# Altium footprint library MyPcbLib.PcbLib: 657 footprints (part 29 of 42)
Each footprint in its own frame and in the unit in brackets; x right, y up, seen from the top. Pads: shape width x height; smd on the part's side, far side on the other; paste and mask are expansions set on the pad; w line width, h text height; cw(c..) or ccw(c..) is an arc to the next point about the centre after c.
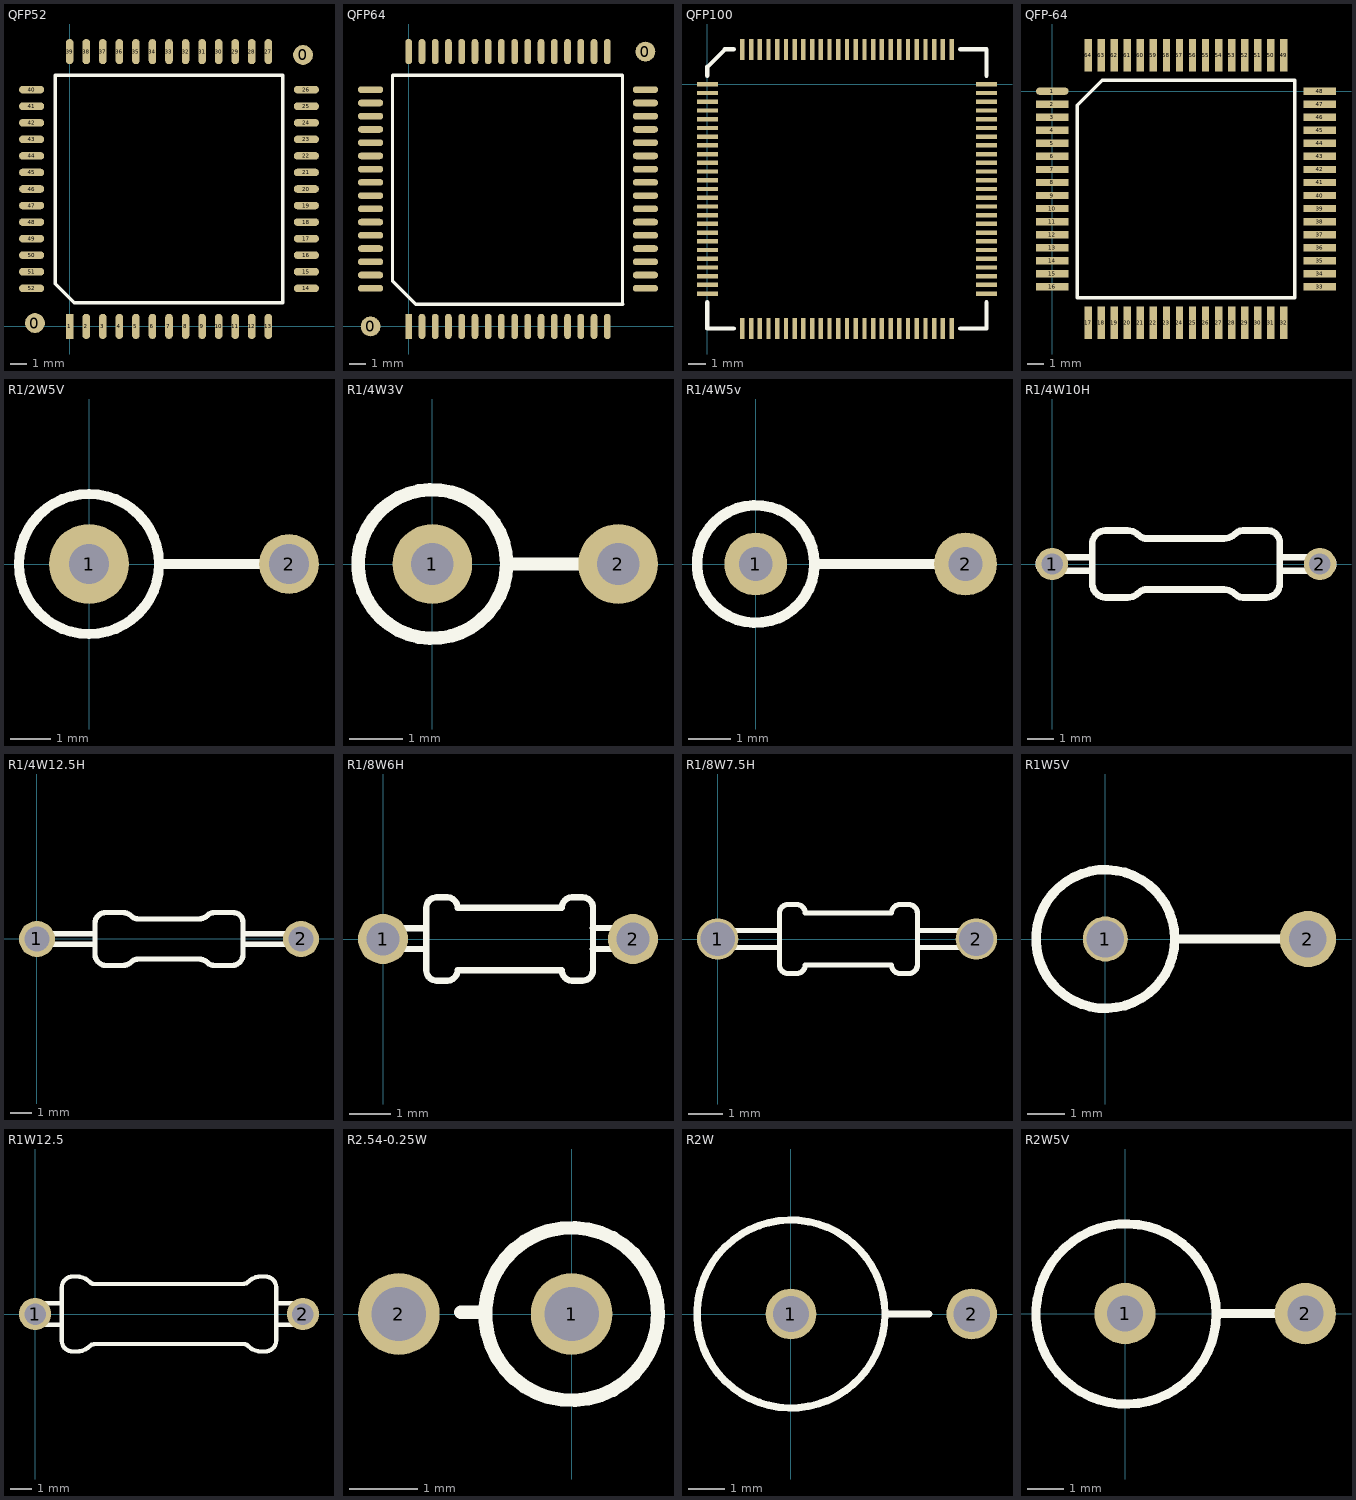
[diagram p28: the footprints below, top view; thin cyan lines are the x and y axes]

## QFP52 [mil]
pads (54):
  round 47.24 smd: 0(-82.68,7.87) 0(555.12,645.67)
  rect 18x60 smd: 1(0,0)
  oval 18x60 smd: 2(39.37,0) 3(78.74,0) 4(118.11,0) 5(157.48,0) 6(196.85,0) 7(236.22,0) 8(275.59,0) 9(314.96,0) 10(354.33,0) 11(393.7,0) 12(433.07,0) 13(472.44,0) 27(472.44,653.54) 28(433.07,653.54) 29(393.7,653.54) 30(354.33,653.54) 31(314.96,653.54) 32(275.59,653.54) 33(236.22,653.54) 34(196.85,653.54) 35(157.48,653.54) 36(118.11,653.54) 37(78.74,653.54) 38(39.37,653.54) 39(0,653.54)
  oval 60x18 smd: 14(562.99,90.55) 15(562.99,129.92) 16(562.99,169.29) 17(562.99,208.66) 18(562.99,248.03) 19(562.99,287.4) 20(562.99,326.77) 21(562.99,366.14) 22(562.99,405.51) 23(562.99,444.88) 24(562.99,484.25) 25(562.99,523.62) 26(562.99,562.99) 40(-90.55,562.99) 41(-90.55,523.62) 42(-90.55,484.25) 43(-90.55,444.88) 44(-90.55,405.51) 45(-90.55,366.14) 46(-90.55,326.77) 47(-90.55,287.4) 48(-90.55,248.03) 49(-90.55,208.66) 50(-90.55,169.29) 51(-90.55,129.92) 52(-90.55,90.55)
Top Overlay:
  lines w7.87: -34.06,101.18 10.63,56.5 506.5,56.5 506.5,597.05 -34.06,597.05 -34.06,101.18

## QFP64 [mil]
pads (66):
  round 47.24 smd: 0(-90.55,0) 0(562.99,653.54)
  rect 16x60 smd: 1(0,0)
  oval 16x60 smd: 2(31.5,0) 3(62.99,0) 4(94.49,0) 5(125.98,0) 6(157.48,0) 7(188.98,0) 8(220.47,0) 9(251.97,0) 10(283.46,0) 11(314.96,0) 12(346.46,0) 13(377.95,0) 14(409.45,0) 15(440.94,0) 16(472.44,0) 33(472.44,653.54) 34(440.94,653.54) 35(409.45,653.54) 36(377.95,653.54) 37(346.46,653.54) 38(314.96,653.54) 39(283.46,653.54) 40(251.97,653.54) 41(220.47,653.54) 42(188.98,653.54) 43(157.48,653.54) 44(125.98,653.54) 45(94.49,653.54) 46(62.99,653.54) 47(31.5,653.54) 48(0,653.54)
  oval 60x16 smd: 17(562.99,90.55) 18(562.99,122.05) 19(562.99,153.54) 20(562.99,185.04) 21(562.99,216.54) 22(562.99,248.03) 23(562.99,279.53) 24(562.99,311.02) 25(562.99,342.52) 26(562.99,374.02) 27(562.99,405.51) 28(562.99,437.01) 29(562.99,468.5) 30(562.99,500) 31(562.99,531.5) 32(562.99,562.99) 49(-90.55,562.99) 50(-90.55,531.5) 51(-90.55,500) 52(-90.55,468.5) 53(-90.55,437.01) 54(-90.55,405.51) 55(-90.55,374.02) 56(-90.55,342.52) 57(-90.55,311.02) 58(-90.55,279.53) 59(-90.55,248.03) 60(-90.55,216.54) 61(-90.55,185.04) 62(-90.55,153.54) 63(-90.55,122.05) 64(-90.55,90.55)
Top Overlay:
  lines w7.87: -38.34,107.06 -38.34,597.65 508.78,597.65 508.78,52.53
  lines w8: -38.34,107.06 -38.05,107.06 16.47,52.53 508.78,52.53

## QFP100 [mm]
pads (100):
  rect 1.2x0.25 smd: 1(0.004,0.002) 2(0.004,-0.498) 3(0.004,-0.998) 4(0.004,-1.498) 5(0.004,-1.998) 6(0.004,-2.498) 7(0.004,-2.998) 8(0.004,-3.498) 9(0.004,-3.998) 10(0.004,-4.498) 11(0.004,-4.998) 12(0.004,-5.498) 13(0.004,-5.998) 14(0.004,-6.498) 15(0.004,-6.998) 16(0.004,-7.498) 17(0.004,-7.998) 18(0.004,-8.498) 19(0.004,-8.998) 20(0.004,-9.498) 21(0.004,-9.998) 22(0.004,-10.498) 23(0.004,-10.998) 24(0.004,-11.498) 25(0.004,-11.998) 51(16.004,-11.998) 52(16.004,-11.498) 53(16.004,-10.998) 54(16.004,-10.498) 55(16.004,-9.998) 56(16.004,-9.498) 57(16.004,-8.998) 58(16.004,-8.498) 59(16.004,-7.998) 60(16.004,-7.498) 61(16.004,-6.998) 62(16.004,-6.498) 63(16.004,-5.998) 64(16.004,-5.498) 65(16.004,-4.998) 66(16.004,-4.498) 67(16.004,-3.998) 68(16.004,-3.498) 69(16.004,-2.998) 70(16.004,-2.498) 71(16.004,-1.998) 72(16.004,-1.498) 73(16.004,-0.998) 74(16.004,-0.498) 75(16.004,0.002)
  rect 0.25x1.2 smd: 26(2.004,-13.998) 27(2.504,-13.998) 28(3.004,-13.998) 29(3.504,-13.998) 30(4.004,-13.998) 31(4.504,-13.998) 32(5.004,-13.998) 33(5.504,-13.998) 34(6.004,-13.998) 35(6.504,-13.998) 36(7.004,-13.998) 37(7.504,-13.998) 38(8.004,-13.998) 39(8.504,-13.998) 40(9.004,-13.998) 41(9.504,-13.998) 42(10.004,-13.998) 43(10.504,-13.998) 44(11.004,-13.998) 45(11.504,-13.998) 46(12.004,-13.998) 47(12.504,-13.998) 48(13.004,-13.998) 49(13.504,-13.998) 50(14.004,-13.998) 76(14.004,2.002) 77(13.504,2.002) 78(13.004,2.002) 79(12.504,2.002) 80(12.004,2.002) 81(11.504,2.002) 82(11.004,2.002) 83(10.504,2.002) 84(10.004,2.002) 85(9.504,2.002) 86(9.004,2.002) 87(8.504,2.002) 88(8.004,2.002) 89(7.504,2.002) 90(7.004,2.002) 91(6.504,2.002) 92(6.004,2.002) 93(5.504,2.002) 94(5.004,2.002) 95(4.504,2.002) 96(4.004,2.002) 97(3.504,2.002) 98(3.004,2.002) 99(2.504,2.002) 100(2.004,2.002)
Top Overlay:
  lines w0.254: 0.004,-12.498 0.004,-13.998 1.504,-13.998 ; 0.004,0.502 0.004,1.002 1.004,2.002 1.504,2.002 ; 14.504,-13.998 16.004,-13.998 16.004,-12.498 ; 14.504,2.002 16.004,2.002 16.004,0.502

## QFP-64 [mm]
pads (64):
  oval 2x0.45 smd: 1(0,0)
  rect 2x0.45 smd: 2(0,-0.8) 3(0,-1.6) 4(0,-2.4) 5(0,-3.2) 6(0,-4) 7(0,-4.8) 8(0,-5.6) 9(0,-6.4) 10(0,-7.2) 11(0,-8) 12(0,-8.8) 13(0,-9.6) 14(0,-10.4) 15(0,-11.2) 16(0,-12) 33(16.4,-12) 34(16.4,-11.2) 35(16.4,-10.4) 36(16.4,-9.6) 37(16.4,-8.8) 38(16.4,-8) 39(16.4,-7.2) 40(16.4,-6.4) 41(16.4,-5.6) 42(16.4,-4.8) 43(16.4,-4) 44(16.4,-3.2) 45(16.4,-2.4) 46(16.4,-1.6) 47(16.4,-0.8) 48(16.4,0)
  rect 0.45x2 smd: 17(2.2,-14.2) 18(3,-14.2) 19(3.8,-14.2) 20(4.6,-14.2) 21(5.4,-14.2) 22(6.2,-14.2) 23(7,-14.2) 24(7.8,-14.2) 25(8.6,-14.2) 26(9.4,-14.2) 27(10.2,-14.2) 28(11,-14.2) 29(11.8,-14.2) 30(12.6,-14.2) 31(13.4,-14.2) 32(14.2,-14.2) 49(14.2,2.2) 50(13.4,2.2) 51(12.6,2.2) 52(11.8,2.2) 53(11,2.2) 54(10.2,2.2) 55(9.4,2.2) 56(8.6,2.2) 57(7.8,2.2) 58(7,2.2) 59(6.2,2.2) 60(5.4,2.2) 61(4.6,2.2) 62(3.8,2.2) 63(3,2.2) 64(2.2,2.2)
Top Overlay:
  lines w0.2: 1.535,-12.665 14.865,-12.665 14.865,0.665 3.07,0.665 1.535,-0.87 1.535,-12.665

## R1/2W5V [mm]
pads (2):
  round 2 hole 1: 1(0,0)
  round 1.5 / inner round 1.5 / far side round 2 hole 1: 2(5,0)
Top Overlay:
  circle w0.254: c0,0 r1.75
  lines w0.25: 1.75,0 5,0

## R1/4W3V [mm]
pads (2):
  round 1.5 / inner round 1.5 / far side round 1.8 hole 0.8: 1(0,0) 2(3.5,0)
Top Overlay:
  circle w0.254: c0,0 r1.4
  lines w0.25: 1.4,0 3.5,0

## R1/4W5v [mm]
pads (2):
  round 1.5 / inner round 1.5 / far side round 1.8 hole 0.8: 1(0,0) 2(5,0)
Top Overlay:
  circle w0.254: c0,0 r1.4
  lines w0.25: 1.4,0 5,0

## R1/4W10H [mm]
pads (2):
  round 1.2 / inner round 1.2 / far side round 1.8 hole 0.8: 1(0,0) 2(10,0)
Top Overlay:
  lines w0.25: -0.25,0.25 1.5,0.25 ; -0.249,-0.25 1.5,-0.25 ; 8.5,-0.25 10.25,-0.25 ; 8.5,0.25 10.25,0.25 ; 1.5,-0.75 ccw(c2.025,-0.725) 2,-1.25 2.806,-1.25 ccw(c2.806,-0.631) 3.244,-1.069 cw(c3.53,-1.355) 3.53,-0.95 6.407,-0.95 cw(c6.407,-1.556) 6.836,-1.128 ccw(c7.132,-0.832) 7.132,-1.25 7.291,-1.25 8,-1.25 ccw(c7.987,-0.737) 8.5,-0.75 8.5,0.78 ccw(c8.045,0.795) 8.03,1.25 7.291,1.25 7.132,1.25 ccw(c7.132,0.832) 6.836,1.128 cw(c6.407,1.556) 6.407,0.95 3.53,0.95 cw(c3.53,1.355) 3.244,1.069 ccw(c2.806,0.631) 2.806,1.25 2,1.25 ccw(c1.995,0.755) 1.5,0.75 1.5,-0.75
  lines w0.254: -0.25,0.25 ccw(c-0.25,0) -0.249,-0.25 ; 10.25,-0.25 ccw(c10.25,0) 10.25,0.25

## R1/4W12.5H [mm]
pads (2):
  round 1.7 / inner round 1.7 / far side round 2.8 hole 1.2: 1(0,0) 2(12.5,0)
Top Overlay:
  lines w0.25: -0.401,0.25 2.75,0.25 ; -0.4,-0.25 2.75,-0.25 ; 9.75,-0.25 12.8,-0.25 ; 9.75,0.25 12.8,0.25 ; 2.75,-0.75 ccw(c3.275,-0.725) 3.25,-1.25 4.056,-1.25 ccw(c4.056,-0.631) 4.494,-1.069 cw(c4.78,-1.355) 4.78,-0.95 7.657,-0.95 cw(c7.657,-1.556) 8.086,-1.128 ccw(c8.381,-0.832) 8.381,-1.25 8.541,-1.25 9.25,-1.25 ccw(c9.237,-0.737) 9.75,-0.75 9.75,0.78 ccw(c9.295,0.795) 9.28,1.25 8.541,1.25 8.381,1.25 ccw(c8.381,0.832) 8.086,1.128 cw(c7.657,1.556) 7.657,0.95 4.78,0.95 cw(c4.78,1.355) 4.494,1.069 ccw(c4.056,0.631) 4.056,1.25 3.25,1.25 ccw(c3.245,0.755) 2.75,0.75 2.75,-0.75
  lines w0.254: -0.401,0.25 ccw(c-0.401,0) -0.4,-0.25 ; 12.8,-0.25 ccw(c12.8,0) 12.8,0.25

## R1/8W6H [mm]
pads (2):
  round 1.2 / inner round 1.2 / far side round 1.6 hole 0.8: 1(0,0) 2(6,0)
Top Overlay:
  lines w0.15: 0.997,0.26 -0.003,0.26 ccw(c-0.003,0.01) -0.003,-0.24 1.037,-0.24 ; 5.035,-0.239 5.995,-0.239 ccw(c5.995,0.011) 5.985,0.261 5.035,0.261 ; 5.04,0.75 5.04,-0.75 cw(c4.79,-0.75) 4.79,-1 4.54,-1 cw(c4.54,-0.75) 4.29,-0.75 1.79,-0.75 cw(c1.54,-0.75) 1.54,-1 1.29,-1 cw(c1.29,-0.75) 1.04,-0.75 1.04,0.75 cw(c1.29,0.75) 1.29,1 1.54,1 cw(c1.54,0.75) 1.79,0.75 4.29,0.75 cw(c4.54,0.75) 4.54,1 4.79,1 cw(c4.79,0.75) 5.04,0.75

## R1/8W7.5H [mm]
pads (2):
  round 1.2 / inner round 1.2 / far side round 2 hole 1: 1(0,0) 2(7.5,0)
Top Overlay:
  lines w0.15: 1.79,-0.25 -0.003,-0.25 cw(c-0.003,0) -0.003,0.25 1.79,0.25 ; 5.04,-0.75 2.54,-0.75 cw(c2.29,-0.75) 2.29,-1 2.04,-1 cw(c2.04,-0.75) 1.79,-0.75 1.79,0.75 cw(c2.04,0.75) 2.04,1 2.29,1 cw(c2.29,0.75) 2.54,0.75 5.04,0.75 ; 5.04,-0.75 ccw(c5.29,-0.75) 5.29,-1 5.54,-1 ccw(c5.54,-0.75) 5.79,-0.75 5.79,0.75 ccw(c5.54,0.75) 5.54,1 5.29,1 ccw(c5.29,0.75) 5.04,0.75 ; 5.79,-0.25 7.495,-0.25 ccw(c7.495,0) 7.485,0.25 5.79,0.25

## R1W5V [mm]
pads (2):
  round 1.2 / inner round 1.2 / far side round 2 hole 1: 1(0,0)
  round 1.5 hole 1: 2(5.4,0)
Top Overlay:
  circle w0.254: c0,0 r1.85
  lines w0.25: 1.85,0 5,0

## R1W12.5 [mm]
pads (2):
  round 1.5 hole 1: 1(0,0) 2(12.5,0)
Top Overlay:
  lines w0.2: 1.251,-0.5 -0.1,-0.5 cw(c-0.1,0) -0.1,0.5 1.251,0.5 ; 9.496,-1.396 9.706,-1.396 cw(c9.706,-1.741) 9.95,-1.497 ccw(c10.551,-0.896) 10.551,-1.746 10.75,-1.746 ccw(c10.737,-1.234) 11.25,-1.246 11.25,1.254 ccw(c10.737,1.241) 10.75,1.754 10.551,1.754 ccw(c10.551,0.904) 9.95,1.505 cw(c9.706,1.749) 9.706,1.404 9.496,1.404 ; 9.5,-1.4 3,-1.4 2.79,-1.4 ccw(c2.79,-1.745) 2.546,-1.501 cw(c1.945,-0.9) 1.945,-1.75 1.746,-1.75 cw(c1.759,-1.237) 1.246,-1.25 1.246,1.25 cw(c1.759,1.237) 1.746,1.75 1.945,1.75 cw(c1.945,0.9) 2.546,1.501 ccw(c2.79,1.745) 2.79,1.4 3,1.4 9.5,1.4 ; 11.249,-0.5 12.6,-0.5 ccw(c12.6,0) 12.6,0.5 11.249,0.5

## R2.54-0.25W [mm]
pads (2):
  round 1.2 hole 0.8: 1(0,0) 2(-2.54,0)
Top Overlay:
  circle w0.203: c0,0 r1.27
  lines w0.203: -1.626,0.025 -1.321,0.025

## R2W [mm]
pads (2):
  round 1.4 hole 1: 1(0,0) 2(5,0)
Top Overlay:
  circle w0.203: c0,0 r2.6
  lines w0.203: 2.6,0 3.81,0

## R2W5V [mm]
pads (2):
  round 1.7 / inner round 1.7 / far side round 2.5 hole 1: 1(0,0) 2(5,0)
Top Overlay:
  circle w0.254: c0.03,-0.01 r2.5
  lines w0.254: 2.54,0 4.572,0